# Altium schematic symbol library IC_ADI.SCHLIB: 3169 symbols (part 128 of 181)
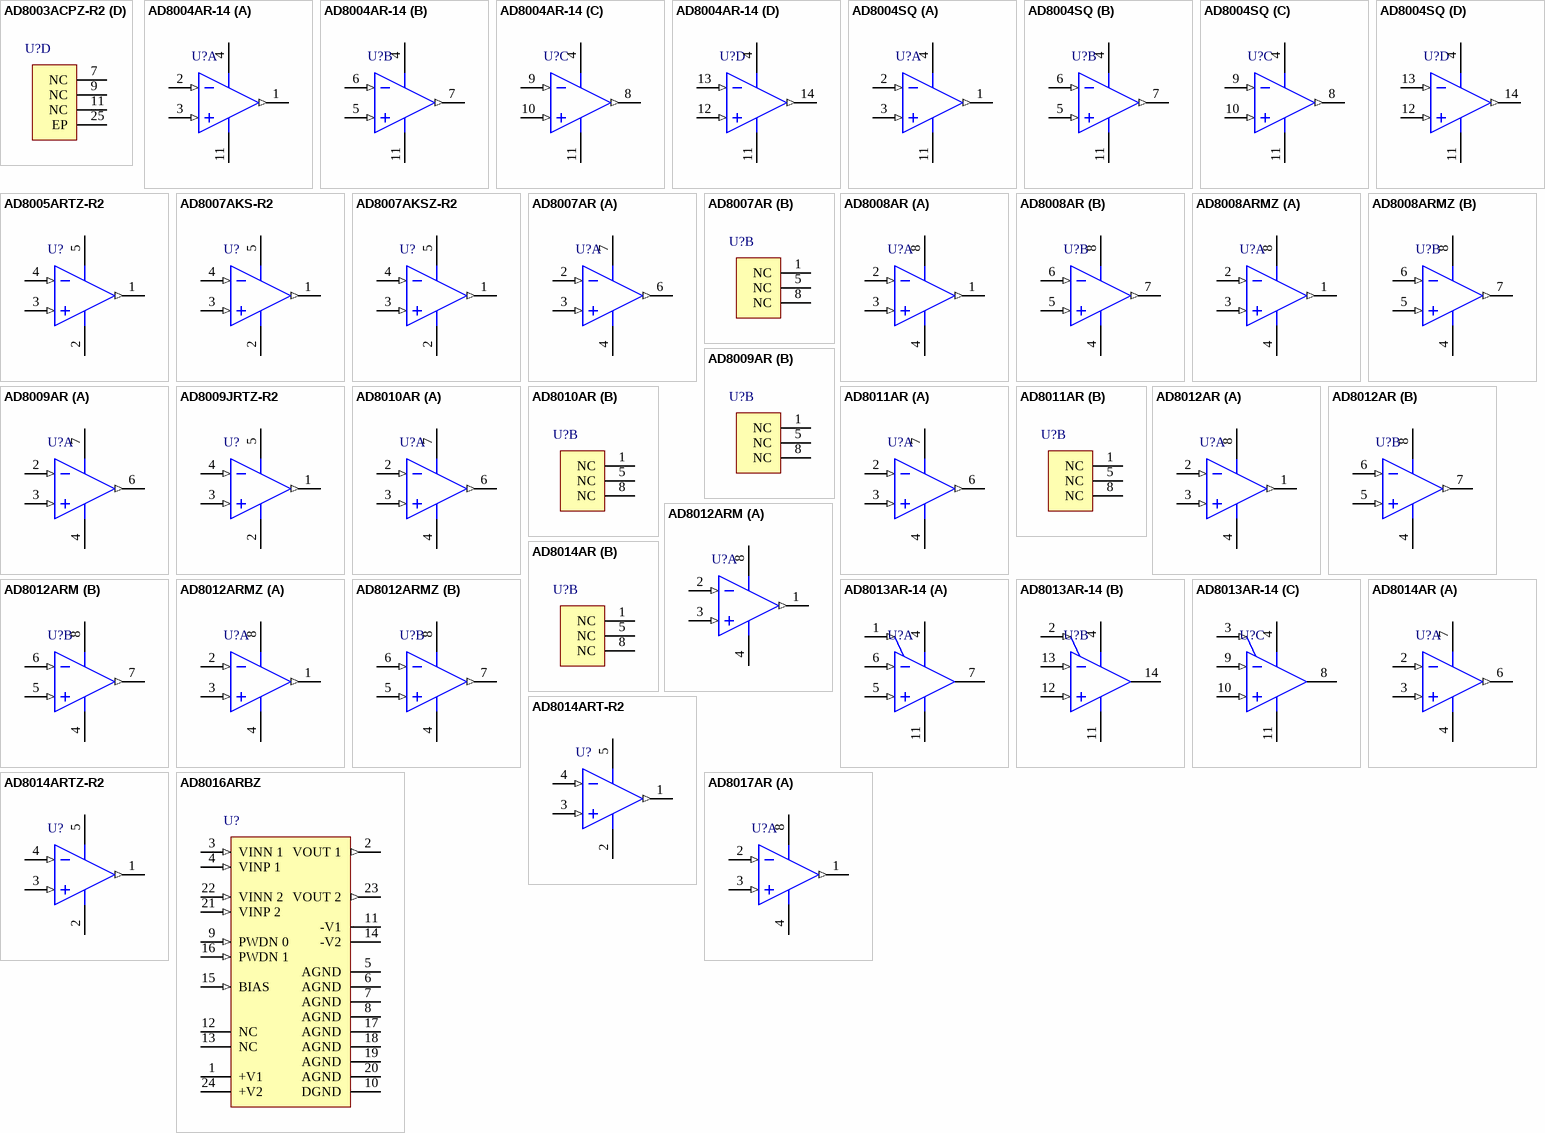
[diagram p318: symbols AD8003ACPZ-R2 to AD8017AR]

## AD8009AR
designator U?
Single Channel Wide Bandwidth Operational Amplifier, 1 GHz BW, 5.5 KV/us SR, Industrial, 8-pin SOIC (R-8), Tube; Generic Part Number: AD8009; PartNumber: AD8009AR; Amplifiers Per Package: 1; Input Bias Current: 50uA; Input Offset Voltage: 2mV; Iq/Amp: 16mA; Small Signal Bandwidth: 1GHz; V Span Max: 12V; V Span Min: 5V; DatasheetVersion: Rev. F; PackageVersion: 060506-A; PackageReference: R-8; PackageDescription: 8-Pin Standard Small Outline Package, Body 3.9 x 4.9 mm, Pitch 1.27 mm; Supplier Part Number 1: AD8009AR-ND; Packing: Tube; Slew Rate: 5.5KV/us; Mounting Technology: Surface Mount; Code_JEDEC: MS-012-AA; ComponentLink1Description: Manufacturer URL; ComponentLink2Description: Datasheet; ComponentLink3Description: Package Specification
footprint SOIC8_1.27 (Footprint not found)
part A pins: 2 -IN (in), 3 +IN (in), 4 -VS (power), 6 OUT (out), 7 +VS (power)
part B pins: 1 NC, 5 NC, 8 NC

## AD8009JRTZ-R2
designator U?
Single Channel Wide Bandwidth Operational Amplifier, 1 GHz BW, 5.5 KV/us SR, Commercial, 5-pin SOT23 (RJ-5), Reel; Generic Part Number: AD8009; PartNumber: AD8009JRTZ-R2; Amplifiers Per Package: 1; Input Bias Current: 50uA; Input Offset Voltage: 2mV; Iq/Amp: 16mA; Small Signal Bandwidth: 1GHz; V Span Max: 12V; V Span Min: 5V; DatasheetVersion: Rev. F; PackageVersion: 121608-A; PackageReference: RJ-5; PackageDescription: 5-Pin Small Outline Transistor Package, Body 2.9 x 1.6 mm, Pitch 0.95 mm; Supplier Part Number 1: AD8009JRTZ-R2CT-ND; Supplier Part Number 2: 1651269; Supplier Part Number 3: 1651269RL; Supplier Part Number 4: 19M8868; Packing: Reel; Slew Rate: 5.5KV/us; Mounting Technology: Surface Mount; Code_JEDEC: MO-178-AA; ComponentLink1Description: Manufacturer URL; ComponentLink2Description: Datasheet; ComponentLink3Description: Package Specification
footprint SOT23-5 (Footprint not found)
pins: 1 VOUT (out), 2 -VS (power), 3 +IN (in), 4 -IN (in), 5 +VS (power)

## AD8010AR
designator U?
Single Channel Operational Amplifier, 230 MHz BW, 800 V/us SR, Industrial, 8-pin SOIC (R-8), Tube; Generic Part Number: AD8010; PartNumber: AD8010AR; Amplifiers Per Package: 1; Input Bias Current: 6uA; Input Offset Voltage: 5mV; Iq/Amp: 17mA; Small Signal Bandwidth: 230MHz; V Span Max: 12V; V Span Min: 9V; DatasheetVersion: Rev. B; PackageVersion: 060506-A; PackageReference: R-8; PackageDescription: 8-Pin Standard Small Outline Package, Body 3.9 x 4.9 mm, Pitch 1.27 mm; Supplier Part Number 1: AD8010AR-ND; Slew Rate: 800V/us; Mounting Technology: Surface Mount; Code_JEDEC: MS-012-AA; ComponentLink1Description: Manufacturer URL; ComponentLink2Description: Datasheet; ComponentLink3Description: Package Specification
footprint SOIC8_1.27 (Footprint not found)
part A pins: 2 -IN (in), 3 +IN (in), 4 -VS (power), 6 OUT (out), 7 +VS (power)
part B pins: 1 NC, 5 NC, 8 NC

## AD8011AR
designator U?
Single Channel Single-Supply Operation Operational Amplifier, 400 MHz BW, 3.5 KV/us SR, Industrial, 8-pin SOIC (R-8), Tube; Generic Part Number: AD8011; PartNumber: AD8011AR; Amplifiers Per Package: 1; Input Bias Current: 5uA; Input Offset Voltage: 2mV; Iq/Amp: 1.3mA; Small Signal Bandwidth: 400MHz; V Span Max: 12V; V Span Min: 3V; DatasheetVersion: Rev. C; PackageVersion: 060506-A; PackageReference: R-8; PackageDescription: 8-Pin Standard Small Outline Package, Body 3.9 x 4.9 mm, Pitch 1.27 mm; Supplier Part Number 1: AD8011AR-ND; Slew Rate: 3.5KV/us; Mounting Technology: Surface Mount; Code_JEDEC: MS-012-AA; ComponentLink1Description: Manufacturer URL; ComponentLink2Description: Datasheet; ComponentLink3Description: Package Specification
footprint SOIC8_1.27 (Footprint not found)
part A pins: 2 -IN (in), 3 +IN (in), 4 -V (power), 6 OUT (out), 7 +V (power)
part B pins: 1 NC, 5 NC, 8 NC

## AD8012AR
designator U?
Double Channel Low Power Operational Amplifier, 350 MHz BW, 2.25 KV/us SR, Industrial, 8-pin SOIC (R-8), Tube; Generic Part Number: AD8012; PartNumber: AD8012AR; Amplifiers Per Package: 2; Input Bias Current: 3uA; Input Offset Voltage: 1mV; Iq/Amp: 900uA; Small Signal Bandwidth: 350MHz; V Span Max: 12V; V Span Min: 3V; DatasheetVersion: Rev. B; PackageVersion: 060506-A; PackageReference: R-8; PackageDescription: 8-Pin Standard Small Outline Package, Body 3.9 x 4.9 mm, Pitch 1.27 mm; Supplier Part Number 1: AD8012AR-ND; Packing: Tube; Slew Rate: 2.25KV/us; Mounting Technology: Surface Mount; Code_JEDEC: MS-012-AA; ComponentLink1Description: Manufacturer URL; ComponentLink2Description: Datasheet; ComponentLink3Description: Package Specification
footprint SOIC8_1.27 (Footprint not found)
pins on every part: 4 -VS (power), 8 +VS (power)
part A pins: 1 OUT 1 (out), 2 -IN 1 (in), 3 +IN 1 (in)
part B pins: 5 +IN 2 (in), 6 -IN 2 (in), 7 OUT 2 (out)

## AD8012ARM
designator U?
Double Channel Low Power Operational Amplifier, 350 MHz BW, 2.25 KV/us SR, Industrial, 8-pin SOP (RM-8), Tube; Generic Part Number: AD8012; PartNumber: AD8012ARM; Amplifiers Per Package: 2; Input Bias Current: 3uA; Input Offset Voltage: 1mV; Iq/Amp: 900uA; Small Signal Bandwidth: 350MHz; V Span Max: 12V; V Span Min: 3V; DatasheetVersion: Rev. B; PackageReference: RM-8; PackageDescription: 8-Pin Mini Small Outline Package, Body 3 x 3 mm, Pitch 0.65 mm; Supplier Part Number 1: AD8012ARM-ND; Packing: Tube; Slew Rate: 2.25KV/us; Mounting Technology: Surface Mount; Code_JEDEC: MO-187-AA; ComponentLink1Description: Manufacturer URL; ComponentLink2Description: Datasheet; ComponentLink3Description: Package Specification
footprint VSSOP8_0.65 (Footprint not found)
pins on every part: 4 -VS (power), 8 +VS (power)
part A pins: 1 OUT 1 (out), 2 -IN 1 (in), 3 +IN 1 (in)
part B pins: 5 +IN 2 (in), 6 -IN 2 (in), 7 OUT 2 (out)

## AD8012ARMZ
designator U?
Double Channel Low Power Operational Amplifier, 350 MHz BW, 2.25 KV/us SR, Industrial, 8-pin SOP (RM-8), Tube; Generic Part Number: AD8012; PartNumber: AD8012ARMZ; Amplifiers Per Package: 2; Input Bias Current: 3uA; Input Offset Voltage: 1mV; Iq/Amp: 900uA; Small Signal Bandwidth: 350MHz; V Span Max: 12V; V Span Min: 3V; DatasheetVersion: Rev. B; PackageReference: RM-8; PackageDescription: 8-Pin Mini Small Outline Package, Body 3 x 3 mm, Pitch 0.65 mm; Supplier Part Number 1: AD8012ARMZ-ND; Supplier Part Number 2: 1424017; Supplier Part Number 3: 82H2943; Packing: Tube; Slew Rate: 2.25KV/us; Mounting Technology: Surface Mount; Code_JEDEC: MO-187-AA; ComponentLink1Description: Manufacturer URL; ComponentLink2Description: Datasheet; ComponentLink3Description: Package Specification
footprint VSSOP8_0.65 (Footprint not found)
pins on every part: 4 -VS (power), 8 +VS (power)
part A pins: 1 OUT 1 (out), 2 -IN 1 (in), 3 +IN 1 (in)
part B pins: 5 +IN 2 (in), 6 -IN 2 (in), 7 OUT 2 (out)

## AD8013AR-14
designator U?
3 Channel Low Power Operational Amplifier, 480 MHz BW, 1 KV/us SR, Industrial, 14-pin SOIC (R-14), Tube; Generic Part Number: AD8013; PartNumber: AD8013AR-14; Amplifiers Per Package: 3; Input Bias Current: 3uA; Input Offset Voltage: 2mV; Iq/Amp: 4mA; Slew Rate: 1KV/us; Small Signal Bandwidth: 480MHz; V Span Max: 13V; V Span Min: 4.2V; DatasheetVersion: Rev. A; PackageVersion: 060606-A; PackageReference: R-14; PackageDescription: 14-Pin Standard Small Outline Package, Body 8.65 x 3.9 mm, Pitch 1.27 mm; Supplier Part Number 1: AD8013AR-14-ND; Mounting Technology: Surface Mount; Code_JEDEC: MS-012-AB; ComponentLink1Description: Manufacturer URL; ComponentLink2Description: Datasheet; ComponentLink3Description: Package Specification
footprint SOIC14_1.27 (Footprint not found)
pins on every part: 4 +VS (power), 11 -VS (power)
part A pins: 1 DISABLE 1 (in), 5 +IN 1 (in), 6 -IN 1 (in), 7 OUT 1 (hiz)
part B pins: 2 DISABLE 2 (in), 12 +IN 2 (in), 13 -IN 2 (in), 14 OUT 2 (hiz)
part C pins: 3 DISABLE 3 (in), 8 OUT 3 (hiz), 9 -IN 3 (in), 10 +IN 3 (in)

## AD8014AR
designator U?
Single Channel Very Low Noise Operational Amplifier, 400 MHz BW, 4 KV/us SR, Industrial, 8-pin SOIC (R-8), Tube; Generic Part Number: AD8014; PartNumber: AD8014AR; Amplifiers Per Package: 1; Input Bias Current: 5uA; Input Offset Voltage: 2mV; Iq/Amp: 1.3mA; Slew Rate: 4KV/us; Small Signal Bandwidth: 400MHz; V Span Max: 12V; V Span Min: 4.5V; DatasheetVersion: Rev. C; PackageVersion: 060506-A; PackageReference: R-8; PackageDescription: 8-Pin Standard Small Outline Package, Body 3.9 x 4.9 mm, Pitch 1.27 mm; Supplier Part Number 1: AD8014AR-ND; Mounting Technology: Surface Mount; Code_JEDEC: MS-012-AA; ComponentLink1Description: Manufacturer URL; ComponentLink2Description: Datasheet; ComponentLink3Description: Package Specification
footprint SOIC8_1.27 (Footprint not found)
part A pins: 2 -IN (in), 3 +IN (in), 4 -VS (power), 6 VOUT (out), 7 +VS (power)
part B pins: 1 NC, 5 NC, 8 NC

## AD8014ART-R2
designator U?
Single Channel Very Low Noise Operational Amplifier, 400 MHz BW, 4 KV/us SR, Industrial, 5-pin SOT23 (RJ-5), Reel; Generic Part Number: AD8014; PartNumber: AD8014ART-R2; Amplifiers Per Package: 1; Input Bias Current: 5uA; Input Offset Voltage: 2mV; Iq/Amp: 1.3mA; Slew Rate: 4KV/us; Small Signal Bandwidth: 400MHz; V Span Max: 12V; V Span Min: 4.5V; DatasheetVersion: Rev. C; PackageVersion: 121608-A; PackageReference: RJ-5; PackageDescription: 5-Pin Small Outline Transistor Package, Body 2.9 x 1.6 mm, Pitch 0.95 mm; Mounting Technology: Surface Mount; Code_JEDEC: MO-178-AA; ComponentLink1Description: Manufacturer URL; ComponentLink2Description: Datasheet; ComponentLink3Description: Package Specification
footprint SOT23-5 (Footprint not found)
pins: 1 VOUT (out), 2 -VS (power), 3 +IN (in), 4 -IN (in), 5 +VS (power)

## AD8014ARTZ-R2
designator U?
Single Channel Very Low Noise Operational Amplifier, 400 MHz BW, 4 KV/us SR, Industrial, 5-pin SOT23 (RJ-5), Reel; Generic Part Number: AD8014; PartNumber: AD8014ARTZ-R2; Amplifiers Per Package: 1; Input Bias Current: 5uA; Input Offset Voltage: 2mV; Iq/Amp: 1.3mA; Slew Rate: 4KV/us; Small Signal Bandwidth: 400MHz; V Span Max: 12V; V Span Min: 4.5V; DatasheetVersion: Rev. C; PackageVersion: 121608-A; PackageReference: RJ-5; PackageDescription: 5-Pin Small Outline Transistor Package, Body 2.9 x 1.6 mm, Pitch 0.95 mm; Supplier Part Number 1: 2074877; Supplier Part Number 2: 2074877RL; Supplier Part Number 3: 76T1820; Mounting Technology: Surface Mount; Code_JEDEC: MO-178-AA; ComponentLink1Description: Manufacturer URL; ComponentLink2Description: Datasheet; ComponentLink3Description: Package Specification
footprint SOT23-5 (Footprint not found)
pins: 1 VOUT (out), 2 -VS (power), 3 +IN (in), 4 -IN (in), 5 +VS (power)

## AD8016ARBZ
designator U?
Double Channel Low Power Operational Amplifier, 380 MHz BW, 1 KV/us SR, Industrial, 24-pin SOIC (RB-24), Tube; Generic Part Number: AD8016; PartNumber: AD8016ARBZ; Amplifiers Per Package: 2; Input Bias Current: 45uA; Input Offset Voltage: 1mV; Iq/Amp: 13.2mA; Slew Rate: 1KV/us; Small Signal Bandwidth: 380MHz; V Span Max: 26V; V Span Min: 6V; DatasheetVersion: 02-23-2012-A; PackageReference: RB-24; PackageDescription: 24-Pin Batwing SOIC, Thermally Enhanced with Fused Leads, Body 15.4 x 7.5 mm, Pitch 1.27 mm; Supplier Part Number 1: AD8016ARBZ-ND; Supplier Part Number 2: 59K6181; Mounting Technology: Surface Mount; Code_JEDEC: MS-013-AD; ComponentLink1Description: Manufacturer URL; ComponentLink2Description: Datasheet; ComponentLink3Description: Package Specification
footprint SOIC24W_1.27 (Footprint not found)
pins: 1 +V1 (power) "Positive Power Supply, Amp 1.", 2 VOUT 1 (out) "Output Signal, Amp 1.", 3 VINN 1 (in) "Negative Input Signal, Amp 1.", 4 VINP 1 (in) "Positive Input Signal, Amp1.", 5 AGND (power) "Analog Ground.", 6 AGND (power) "Analog Ground.", 7 AGND (power) "Analog Ground.", 8 AGND (power) "Analog Ground.", 9 PWDN 0 (in) "Power-Down Input 0.", 10 DGND (power) "Digital Ground.", 11 -V1 (power) "Negative Power Supply, Amp1.", 12 NC "This pin is not connected internally", 13 NC "This pin is not connected internally", 14 -V2 (power) "-V Power Supply, Amp 2.", 15 BIAS (in) "Quiescent Current Adjust.", 16 PWDN 1 (in) "Power-Down Input 1.", 17 AGND (power) "Analog Ground.", 18 AGND (power) "Analog Ground.", 19 AGND (power) "Analog Ground.", 20 AGND (power) "Analog Ground.", 21 VINP 2 (in) "Positive Input Signal, Amp 2.", 22 VINN 2 (in) "Negative Input Signal, Amp 2.", 23 VOUT 2 (out) "Output Signal, Amp 2.", 24 +V2 (power) "Positive Power Supply, Amp 2."

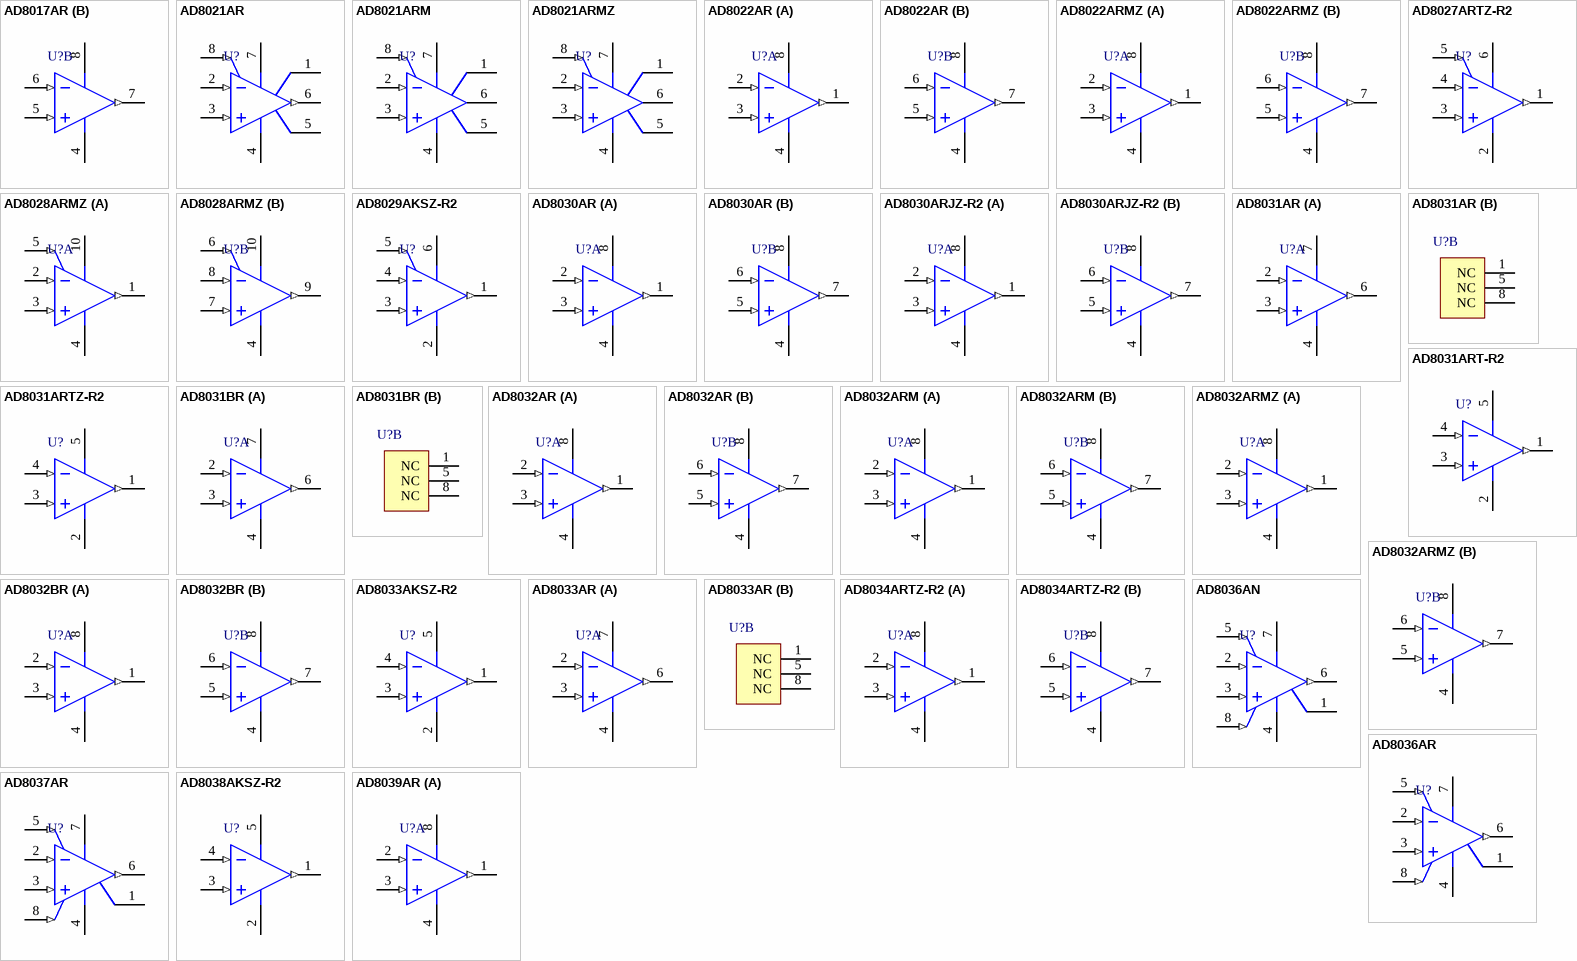
[diagram p91: symbols AD8017AR to AD8039AR]

## AD8017AR
designator U?
Double Channel Low Power Operational Amplifier, 160 MHz BW, 1.6 KV/us SR, Industrial, 8-pin SOIC (R-8), Tube; Generic Part Number: AD8017; PartNumber: AD8017AR; Amplifiers Per Package: 2; Input Bias Current: 160uA; Input Offset Voltage: 1.8mV; Iq/Amp: 7.7mA; Small Signal Bandwidth: 160MHz; V Span Max: 12V; V Span Min: 4.4V; DatasheetVersion: Rev. C; PackageVersion: 060506-A; PackageReference: R-8; PackageDescription: 8-Pin Standard Small Outline Package, Body 3.9 x 4.9 mm, Pitch 1.27 mm; Supplier Part Number 1: AD8017AR-ND; Slew Rate: 1.6KV/us; Mounting Technology: Surface Mount; Code_JEDEC: MS-012-AA; ComponentLink1Description: Manufacturer URL; ComponentLink2Description: Datasheet; ComponentLink3Description: Package Specification
footprint SOIC8_1.27 (Footprint not found)
pins on every part: 4 -VS (power), 8 +VS (power)
part A pins: 1 OUT 1 (out), 2 -IN 1 (in), 3 +IN 1 (in)
part B pins: 5 +IN 2 (in), 6 -IN 2 (in), 7 OUT 2 (out)

## AD8021AR
designator U?
Single Channel Low Power Operational Amplifier, 490 MHz BW, 120 V/us SR, Industrial, 8-pin SOIC (R-8), Tube; Generic Part Number: AD8021; PartNumber: AD8021AR; Amplifiers Per Package: 1; Input Bias Current: 7.5uA; Input Offset Voltage: 400uV; Iq/Amp: 7.7mA; Small Signal Bandwidth: 490MHz; V Span Max: 24V; V Span Min: 4.5V; DatasheetVersion: Rev. F; PackageVersion: 060506-A; PackageReference: R-8; PackageDescription: 8-Pin Standard Small Outline Package, Body 3.9 x 4.9 mm, Pitch 1.27 mm; Supplier Part Number 1: AD8021AR-ND; Slew Rate: 120V/us; Mounting Technology: Surface Mount; Code_JEDEC: MS-012-AA; ComponentLink1Description: Manufacturer URL; ComponentLink2Description: Datasheet; ComponentLink3Description: Package Specification; ComponentLink4Description: Reference Circuit
footprint SOIC8_1.27 (Footprint not found)
pins: 1 LOGIC REFERENCE "Reference for Pin 81 Voltage Level. Connect to logic low supply.", 2 -IN (in) "Inverting Input.", 3 +IN (in) "Noninverting Input.", 4 -VS (power) "Negative Supply Voltage.", 5 CCOMP "Compensation Capacitor. Tie to -VS. (See the Applications section for value.)", 6 VOUT (out) "Output.", 7 +VS (power) "Positive Supply Voltage.", 8 ~{DISABLE} (in) "Disable, Active Low."

## AD8021ARM
designator U?
Single Channel Low Power Operational Amplifier, 490 MHz BW, 120 V/us SR, Industrial, 8-pin SOP (RM-8), Tube; Generic Part Number: AD8021; PartNumber: AD8021ARM; Amplifiers Per Package: 1; Input Bias Current: 7.5uA; Input Offset Voltage: 400uV; Iq/Amp: 7.7mA; Small Signal Bandwidth: 490MHz; V Span Max: 24V; V Span Min: 4.5V; DatasheetVersion: Rev. F; PackageReference: RM-8; PackageDescription: 8-Pin Mini Small Outline Package, Body 3 x 3 mm, Pitch 0.65 mm; Supplier Part Number 1: AD8021ARM-ND; Slew Rate: 120V/us; Mounting Technology: Surface Mount; Code_JEDEC: MO-187-AA; ComponentLink1Description: Manufacturer URL; ComponentLink2Description: Datasheet; ComponentLink3Description: Package Specification; ComponentLink4Description: Reference Circuit
footprint VSSOP8_0.65 (Footprint not found)
pins: 1 LOGIC REFERENCE "Reference for Pin 8 Voltage Level. Connect to logic low supply.", 2 -IN (in) "Inverting Input.", 3 +IN (in) "Noninverting Input.", 4 -VS (power) "Negative Supply Voltage.", 5 CCOMP "Compensation Capacitor. Tie to -VS. (See the Applications section for value.)", 6 VOUT (hiz) "Output.", 7 +VS (power) "Positive Supply Voltage.", 8 ~{DISABLE} (in) "Disable, Active Low."

## AD8021ARMZ
designator U?
Single Channel Low Power Operational Amplifier, 490 MHz BW, 120 V/us SR, Industrial, 8-pin SOP (RM-8), Tube; Generic Part Number: AD8021; PartNumber: AD8021ARMZ; Amplifiers Per Package: 1; Input Bias Current: 7.5uA; Input Offset Voltage: 400uV; Iq/Amp: 7.7mA; Small Signal Bandwidth: 490MHz; V Span Max: 24V; V Span Min: 4.5V; DatasheetVersion: Rev. F; PackageReference: RM-8; PackageDescription: 8-Pin Mini Small Outline Package, Body 3 x 3 mm, Pitch 0.65 mm; Supplier Part Number 1: AD8021ARMZ-ND; Supplier Part Number 2: 1651289; Supplier Part Number 3: 19M8871; Slew Rate: 120V/us; Mounting Technology: Surface Mount; Code_JEDEC: MO-187-AA; ComponentLink1Description: Manufacturer URL; ComponentLink2Description: Datasheet; ComponentLink3Description: Package Specification; ComponentLink4Description: Reference Circuit
footprint VSSOP8_0.65 (Footprint not found)
pins: 1 LOGIC REFERENCE "Reference for Pin 8 Voltage Level. Connect to logic low supply.", 2 -IN (in) "Inverting Input.", 3 +IN (in) "Noninverting Input.", 4 -VS (power) "Negative Supply Voltage.", 5 CCOMP "Compensation Capacitor. Tie to -VS. (See the Applications section for value.)", 6 VOUT (hiz) "Output.", 7 +VS (power) "Positive Supply Voltage.", 8 ~{DISABLE} (in) "Disable, Active Low."

## AD8022AR
designator U?
Double Channel Low Power Operational Amplifier, 130 MHz BW, 50 V/us SR, Industrial, 8-pin SOIC (R-8), Tube; Generic Part Number: AD8022; PartNumber: AD8022AR; Amplifiers Per Package: 2; Input Bias Current: 2.5uA; Input Offset Voltage: 1.5mV; Iq/Amp: 5.5mA; Slew Rate: 50V/us; Small Signal Bandwidth: 130MHz; V Span Max: 26V; V Span Min: 4.5V; DatasheetVersion: Rev. C; PackageVersion: 060506-A; PackageReference: R-8; PackageDescription: 8-Pin Standard Small Outline Package, Body 3.9 x 4.9 mm, Pitch 1.27 mm; Supplier Part Number 1: AD8022AR-ND; Mounting Technology: Surface Mount; Code_JEDEC: MS-012-AA; ComponentLink1Description: Manufacturer URL; ComponentLink2Description: Datasheet; ComponentLink3Description: Package Specification; ComponentLink4Description: Reference Circuit
footprint SOIC8_1.27 (Footprint not found)
pins on every part: 4 -VS (power), 8 +VS (power)
part A pins: 1 OUT 1 (out), 2 -IN 1 (in), 3 +IN 1 (in)
part B pins: 5 +IN 2 (in), 6 -IN 2 (in), 7 OUT 2 (out)

## AD8022ARMZ
designator U?
Double Channel Low Power Operational Amplifier, 130 MHz BW, 50 V/us SR, Industrial, 8-pin SOP (RM-8), Tube; Generic Part Number: AD8022; PartNumber: AD8022ARMZ; Amplifiers Per Package: 2; Input Bias Current: 2.5uA; Input Offset Voltage: 1.5mV; Iq/Amp: 5.5mA; Slew Rate: 50V/us; Small Signal Bandwidth: 130MHz; V Span Max: 26V; V Span Min: 4.5V; DatasheetVersion: Rev. C; PackageReference: RM-8; PackageDescription: 8-Pin Mini Small Outline Package, Body 3 x 3 mm, Pitch 0.65 mm; Supplier Part Number 1: AD8022ARMZ-ND; Supplier Part Number 2: 1699612; Supplier Part Number 3: 59K6199; Mounting Technology: Surface Mount; Code_JEDEC: MO-187-AA; ComponentLink1Description: Manufacturer URL; ComponentLink2Description: Datasheet; ComponentLink3Description: Package Specification; ComponentLink4Description: Reference Circuit
footprint VSSOP8_0.65 (Footprint not found)
pins on every part: 4 -VS (power), 8 +VS (power)
part A pins: 1 OUT 1 (out), 2 -IN 1 (in), 3 +IN 1 (in)
part B pins: 5 +IN 2 (in), 6 -IN 2 (in), 7 OUT 2 (out)

## AD8027ARTZ-R2
designator U?
Single Channel Low Power Operational Amplifier, 190 MHz BW, 100 V/us SR, Industrial, 6-pin SOT23 (RJ-6), Reel; Generic Part Number: AD8027; PartNumber: AD8027ARTZ-R2; Amplifiers Per Package: 1; Input Bias Current: 3.8uA; Input Offset Voltage: 200uV; Iq/Amp: 8.5mA; Small Signal Bandwidth: 190MHz; V Span Max: 12V; V Span Min: 2.7V; DatasheetVersion: Rev. C; PackageVersion: 121608-A; PackageReference: RJ-6; PackageDescription: 6-Pin Small Outline Transistor Package, Body 2.9 x 1.6 mm, Pitch 0.95 mm; Supplier Part Number 1: AD8027ARTZ-R2CT-ND; Slew Rate: 100V/us; Mounting Technology: Surface Mount; Code_JEDEC: MO-178-AB; ComponentLink1Description: Manufacturer URL; ComponentLink2Description: Datasheet; ComponentLink3Description: Package Specification
footprint SOT23-6 (Footprint not found)
pins: 1 VOUT (out), 2 -VS (power), 3 +IN (in), 4 -IN (in), 5 ~{DISABLE}/SELECT (in), 6 +VS (power)

## AD8028ARMZ
designator U?
Double Channel Low Power Operational Amplifier, 190 MHz BW, 100 V/us SR, Industrial, 10-pin SOP (RM-10), Tube; Generic Part Number: AD8028; PartNumber: AD8028ARMZ; Amplifiers Per Package: 2; Input Bias Current: 4uA; Input Offset Voltage: 200uV; Iq/Amp: 8.5mA; Small Signal Bandwidth: 190MHz; V Span Max: 12V; V Span Min: 2.7V; DatasheetVersion: Rev. C; PackageReference: RM-10; PackageDescription: 10-Pin Mini Small Outline Package, Body 3 x 3 mm, Pitch 0.5 mm; Supplier Part Number 1: AD8028ARMZ-ND; Supplier Part Number 2: 59K6213; Slew Rate: 100V/us; Mounting Technology: Surface Mount; Code_JEDEC: MO-187-BA; ComponentLink1Description: Manufacturer URL; ComponentLink2Description: Datasheet; ComponentLink3Description: Package Specification
footprint VSSOP10_0.5 (Footprint not found)
pins on every part: 4 -VS (power), 10 +VS (power)
part A pins: 1 VOUT A (out), 2 -IN A (in), 3 +IN A (in), 5 ~{DISABLE}/SELECT A (in)
part B pins: 6 ~{DISABLE}/SELECT B (in), 7 +IN B (in), 8 -IN B (in), 9 VOUT B (out)

## AD8029AKSZ-R2
designator U?
Single Channel RRIO Operational Amplifier, 125 MHz BW, 62 V/us SR, Industrial, 6-pin SOT23 (KS-6), Reel; Generic Part Number: AD8029; PartNumber: AD8029AKSZ-R2; Amplifiers Per Package: 1; Input Bias Current: 700nA; Input Offset Voltage: 1.6mV; Iq/Amp: 1.5mA; Slew Rate: 62V/us; Small Signal Bandwidth: 125MHz; V Span Max: 12V; V Span Min: 2.7V; DatasheetVersion: Rev. B; PackageVersion: 072809-A; PackageReference: KS-6; PackageDescription: 6-Pin Thin Shrink Small Outline Transistor Package, Body 2 x 1.25 mm, Pitch 0.65 mm; Supplier Part Number 1: AD8029AKSZ-R2CT-ND; Supplier Part Number 2: 59K6221; Mounting Technology: Surface Mount; Code_JEDEC: MO-203-AB; ComponentLink1Description: Manufacturer URL; ComponentLink2Description: Datasheet; ComponentLink3Description: Package Specification
footprint SOT363 (Footprint not found)
pins: 1 VOUT (out), 2 -VS (power), 3 +IN (in), 4 -IN (in), 5 ~{DISABLE} (in), 6 +VS (power)

## AD8030AR
designator U?
Double Channel RRIO Operational Amplifier, 125 MHz BW, 62 V/us SR, Industrial, 8-pin SOIC (R-8), Tube; Generic Part Number: AD8030; PartNumber: AD8030AR; Amplifiers Per Package: 2; Input Bias Current: 700nA; Input Offset Voltage: 1.6mV; Iq/Amp: 1.5mA; Slew Rate: 62V/us; Small Signal Bandwidth: 125MHz; V Span Max: 12V; V Span Min: 2.7V; DatasheetVersion: Rev. B; PackageVersion: 060506-A; PackageReference: R-8; PackageDescription: 8-Pin Standard Small Outline Package, Body 3.9 x 4.9 mm, Pitch 1.27 mm; Supplier Part Number 1: AD8030AR-ND; Mounting Technology: Surface Mount; Code_JEDEC: MS-012-AA; ComponentLink1Description: Manufacturer URL; ComponentLink2Description: Datasheet; ComponentLink3Description: Package Specification
footprint SOIC8_1.27 (Footprint not found)
pins on every part: 4 -VS (power), 8 +VS (power)
part A pins: 1 VOUT 1 (out), 2 -IN 1 (in), 3 +IN 1 (in)
part B pins: 5 +IN 2 (in), 6 -IN 2 (in), 7 VOUT 2 (out)

## AD8030ARJZ-R2
designator U?
Double Channel RRIO Operational Amplifier, 125 MHz BW, 62 V/us SR, Industrial, 8-pin SOT23 (RJ-8), Reel; Generic Part Number: AD8030; PartNumber: AD8030ARJZ-R2; Amplifiers Per Package: 2; Input Bias Current: 700nA; Input Offset Voltage: 1.6mV; Iq/Amp: 1.5mA; Slew Rate: 62V/us; Small Signal Bandwidth: 125MHz; V Span Max: 12V; V Span Min: 2.7V; DatasheetVersion: Rev. B; PackageVersion: 121608-A; PackageReference: RJ-8; PackageDescription: 8-Pin Small Outline Transistor Package, Body 2.9 x 1.6 mm, Pitch 0.65 mm; Mounting Technology: Surface Mount; Code_JEDEC: MO-178-BA; ComponentLink1Description: Manufacturer URL; ComponentLink2Description: Datasheet; ComponentLink3Description: Package Specification
footprint SOT23-8 (Footprint not found)
pins on every part: 4 -VS (power), 8 +VS (power)
part A pins: 1 VOUT 1 (out), 2 -IN 1 (in), 3 +IN 1 (in)
part B pins: 5 +IN 2 (in), 6 -IN 2 (in), 7 VOUT 2 (out)

## AD8031AR
designator U?
Single Channel RRIO Operational Amplifier, 80 MHz BW, 35 V/us SR, Industrial, 8-pin SOIC (R-8), Tube; Generic Part Number: AD8031; PartNumber: AD8031AR; Amplifiers Per Package: 1; Input Bias Current: 450nA; Input Offset Voltage: 1mV; Iq/Amp: 900uA; Slew Rate: 35V/us; Small Signal Bandwidth: 80MHz; V Span Max: 12V; V Span Min: 2.7V; DatasheetVersion: Rev. D; PackageVersion: 060506-A; PackageReference: R-8; PackageDescription: 8-Pin Standard Small Outline Package, Body 3.9 x 4.9 mm, Pitch 1.27 mm; Supplier Part Number 1: AD8031AR-ND; Packing: Tube; Mounting Technology: Surface Mount; Code_JEDEC: MS-012-AA; ComponentLink1Description: Manufacturer URL; ComponentLink2Description: Datasheet; ComponentLink3Description: Package Specification; ComponentLink4Description: Reference Circuit
footprint SOIC8_1.27 (Footprint not found)
part A pins: 2 -IN (in), 3 +IN (in), 4 -VS (power), 6 OUT (out), 7 +VS (power)
part B pins: 1 NC, 5 NC, 8 NC

## AD8031ART-R2
designator U?
Single Channel RRIO Operational Amplifier, 80 MHz BW, 35 V/us SR, Industrial, 5-pin SOT23 (RJ-5), Reel; Generic Part Number: AD8031; PartNumber: AD8031ART-R2; Amplifiers Per Package: 1; Input Bias Current: 450nA; Input Offset Voltage: 1mV; Iq/Amp: 900uA; Slew Rate: 35V/us; Small Signal Bandwidth: 80MHz; V Span Max: 12V; V Span Min: 2.7V; DatasheetVersion: Rev. D; PackageVersion: 121608-A; PackageReference: RJ-5; PackageDescription: 5-Pin Small Outline Transistor Package, Body 2.9 x 1.6 mm, Pitch 0.95 mm; Supplier Part Number 1: 61H4955; Packing: Reel; Mounting Technology: Surface Mount; Code_JEDEC: MO-178-AA; ComponentLink1Description: Manufacturer URL; ComponentLink2Description: Datasheet; ComponentLink3Description: Package Specification; ComponentLink4Description: Reference Circuit
footprint SOT23-5 (Footprint not found)
pins: 1 VOUT (out), 2 -VS (power), 3 +IN (in), 4 -IN (in), 5 +VS (power)

## AD8031ARTZ-R2
designator U?
Single Channel RRIO Operational Amplifier, 80 MHz BW, 35 V/us SR, Industrial, 5-pin SOT23 (RJ-5), Reel; Generic Part Number: AD8031; PartNumber: AD8031ARTZ-R2; Amplifiers Per Package: 1; Input Bias Current: 450nA; Input Offset Voltage: 1mV; Iq/Amp: 900uA; Slew Rate: 35V/us; Small Signal Bandwidth: 80MHz; V Span Max: 12V; V Span Min: 2.7V; DatasheetVersion: Rev. D; PackageVersion: 121608-A; PackageReference: RJ-5; PackageDescription: 5-Pin Small Outline Transistor Package, Body 2.9 x 1.6 mm, Pitch 0.95 mm; Supplier Part Number 1: 19M8875; Packing: Reel; Mounting Technology: Surface Mount; Code_JEDEC: MO-178-AA; ComponentLink1Description: Manufacturer URL; ComponentLink2Description: Datasheet; ComponentLink3Description: Package Specification; ComponentLink4Description: Reference Circuit
footprint SOT23-5 (Footprint not found)
pins: 1 VOUT (out), 2 -VS (power), 3 +IN (in), 4 -IN (in), 5 +VS (power)

## AD8031BR
designator U?
Single Channel RRIO Operational Amplifier, 80 MHz BW, 35 V/us SR, Industrial, 8-pin SOIC (R-8), Tube; Generic Part Number: AD8031; PartNumber: AD8031BR; Amplifiers Per Package: 1; Input Bias Current: 450nA; Input Offset Voltage: 0.5mV; Iq/Amp: 900uA; Slew Rate: 35V/us; Small Signal Bandwidth: 80MHz; V Span Max: 12V; V Span Min: 2.7V; DatasheetVersion: Rev. D; PackageVersion: 060506-A; PackageReference: R-8; PackageDescription: 8-Pin Standard Small Outline Package, Body 3.9 x 4.9 mm, Pitch 1.27 mm; Supplier Part Number 1: AD8031BR-ND; Packing: Tube; Mounting Technology: Surface Mount; Code_JEDEC: MS-012-AA; ComponentLink1Description: Manufacturer URL; ComponentLink2Description: Datasheet; ComponentLink3Description: Package Specification; ComponentLink4Description: Reference Circuit
footprint SOIC8_1.27 (Footprint not found)
part A pins: 2 -IN (in), 3 +IN (in), 4 -VS (power), 6 OUT (out), 7 +VS (power)
part B pins: 1 NC, 5 NC, 8 NC

## AD8032AR
designator U?
Double Channel RRIO Operational Amplifier, 80 MHz BW, 35 V/us SR, Industrial, 8-pin SOIC (R-8), Tube; Generic Part Number: AD8032; PartNumber: AD8032AR; Amplifiers Per Package: 2; Input Bias Current: 450nA; Input Offset Voltage: 1mV; Iq/Amp: 1.6mA; Slew Rate: 35V/us; Small Signal Bandwidth: 80MHz; V Span Max: 12V; V Span Min: 2.7V; DatasheetVersion: Rev. D; PackageVersion: 060506-A; PackageReference: R-8; PackageDescription: 8-Pin Standard Small Outline Package, Body 3.9 x 4.9 mm, Pitch 1.27 mm; Supplier Part Number 1: AD8032AR-ND; Packing: Tube; Mounting Technology: Surface Mount; Code_JEDEC: MS-012-AA; ComponentLink1Description: Manufacturer URL; ComponentLink2Description: Datasheet; ComponentLink3Description: Package Specification; ComponentLink4Description: Reference Circuit
footprint SOIC8_1.27 (Footprint not found)
pins on every part: 4 -VS (power), 8 +VS (power)
part A pins: 1 OUT 1 (out), 2 -IN 1 (in), 3 +IN 1 (in)
part B pins: 5 +IN 2 (in), 6 -IN 2 (in), 7 OUT 2 (out)

## AD8032ARM
designator U?
Double Channel RRIO Operational Amplifier, 80 MHz BW, 35 V/us SR, Industrial, 8-pin SOP (RM-8), Tube; Generic Part Number: AD8032; PartNumber: AD8032ARM; Amplifiers Per Package: 2; Input Bias Current: 450nA; Input Offset Voltage: 1mV; Iq/Amp: 1.6mA; Slew Rate: 35V/us; Small Signal Bandwidth: 80MHz; V Span Max: 12V; V Span Min: 2.7V; DatasheetVersion: Rev. D; PackageReference: RM-8; PackageDescription: 8-Pin Mini Small Outline Package, Body 3 x 3 mm, Pitch 0.65 mm; Supplier Part Number 1: AD8032ARM-ND; Packing: Tube; Mounting Technology: Surface Mount; Code_JEDEC: MO-187-AA; ComponentLink1Description: Manufacturer URL; ComponentLink2Description: Datasheet; ComponentLink3Description: Package Specification; ComponentLink4Description: Reference Circuit
footprint VSSOP8_0.65 (Footprint not found)
pins on every part: 4 -VS (power), 8 +VS (power)
part A pins: 1 OUT 1 (out), 2 -IN 1 (in), 3 +IN 1 (in)
part B pins: 5 +IN 2 (in), 6 -IN 2 (in), 7 OUT 2 (out)

## AD8032ARMZ
designator U?
Double Channel RRIO Operational Amplifier, 80 MHz BW, 35 V/us SR, Industrial, 8-pin SOP (RM-8), Tube; Generic Part Number: AD8032; PartNumber: AD8032ARMZ; Amplifiers Per Package: 2; Input Bias Current: 450nA; Input Offset Voltage: 1mV; Iq/Amp: 1.6mA; Slew Rate: 35V/us; Small Signal Bandwidth: 80MHz; V Span Max: 12V; V Span Min: 2.7V; DatasheetVersion: Rev. D; PackageReference: RM-8; PackageDescription: 8-Pin Mini Small Outline Package, Body 3 x 3 mm, Pitch 0.65 mm; Supplier Part Number 1: AD8032ARMZ-ND; Supplier Part Number 2: 1660973; Supplier Part Number 3: 19M8876; Packing: Tube; Mounting Technology: Surface Mount; Code_JEDEC: MO-187-AA; ComponentLink1Description: Manufacturer URL; ComponentLink2Description: Datasheet; ComponentLink3Description: Package Specification; ComponentLink4Description: Reference Circuit
footprint VSSOP8_0.65 (Footprint not found)
pins on every part: 4 -VS (power), 8 +VS (power)
part A pins: 1 OUT 1 (out), 2 -IN 1 (in), 3 +IN 1 (in)
part B pins: 5 +IN 2 (in), 6 -IN 2 (in), 7 OUT 2 (out)

## AD8032BR
designator U?
Double Channel RRIO Operational Amplifier, 80 MHz BW, 35 V/us SR, Industrial, 8-pin SOIC (R-8), Tube; Generic Part Number: AD8032; PartNumber: AD8032BR; Amplifiers Per Package: 2; Input Bias Current: 450nA; Input Offset Voltage: 0.5mV; Iq/Amp: 1.6mA; Slew Rate: 35V/us; Small Signal Bandwidth: 80MHz; V Span Max: 12V; V Span Min: 2.7V; DatasheetVersion: Rev. D; PackageVersion: 060506-A; PackageReference: R-8; PackageDescription: 8-Pin Standard Small Outline Package, Body 3.9 x 4.9 mm, Pitch 1.27 mm; Supplier Part Number 1: AD8032BR-ND; Supplier Part Number 2: 16F7608; Packing: Tube; Mounting Technology: Surface Mount; Code_JEDEC: MS-012-AA; ComponentLink1Description: Manufacturer URL; ComponentLink2Description: Datasheet; ComponentLink3Description: Package Specification; ComponentLink4Description: Reference Circuit
footprint SOIC8_1.27 (Footprint not found)
pins on every part: 4 -VS (power), 8 +VS (power)
part A pins: 1 OUT 1 (out), 2 -IN 1 (in), 3 +IN 1 (in)
part B pins: 5 +IN 2 (in), 6 -IN 2 (in), 7 OUT 2 (out)

## AD8033AKSZ-R2
designator U?
Single Channel Very Low Cost Operational Amplifier, 80 MHz BW, 80 V/us SR, Industrial, 5-pin SOT23 (KS-5), Reel; Generic Part Number: AD8033; PartNumber: AD8033AKSZ-R2; Amplifiers Per Package: 1; Input Bias Current: 1.5pA; Input Offset Voltage: 1mV; Iq/Amp: 3.5mA; Slew Rate: 80V/us; Small Signal Bandwidth: 80MHz; V Span Max: 24V; V Span Min: 5V; DatasheetVersion: Rev. D; PackageVersion: 072809-A; PackageReference: KS-5; PackageDescription: 5-Pin Thin Shrink Small Outline Transistor Package, Body 2 x 1.25 mm, Pitch 0.65 mm; Supplier Part Number 1: 28M4089; Mounting Technology: Surface Mount; Code_JEDEC: MO-203-AA; ComponentLink1Description: Manufacturer URL; ComponentLink2Description: Datasheet; ComponentLink3Description: Package Specification
footprint SOT353 (Footprint not found)
pins: 1 VOUT (out), 2 -VS (power), 3 +IN (in), 4 -IN (in), 5 +VS (power)

## AD8033AR
designator U?
Single Channel Very Low Cost Operational Amplifier, 80 MHz BW, 80 V/us SR, Industrial, 8-pin SOIC (R-8), Tube; Generic Part Number: AD8033; PartNumber: AD8033AR; Amplifiers Per Package: 1; Input Bias Current: 1.5pA; Input Offset Voltage: 1mV; Iq/Amp: 3.5mA; Slew Rate: 80V/us; Small Signal Bandwidth: 80MHz; V Span Max: 24V; V Span Min: 5V; DatasheetVersion: Rev. D; PackageVersion: 060506-A; PackageReference: R-8; PackageDescription: 8-Pin Standard Small Outline Package, Body 3.9 x 4.9 mm, Pitch 1.27 mm; Supplier Part Number 1: AD8033AR-ND; Mounting Technology: Surface Mount; Code_JEDEC: MS-012-AA; ComponentLink1Description: Manufacturer URL; ComponentLink2Description: Datasheet; ComponentLink3Description: Package Specification
footprint SOIC8_1.27 (Footprint not found)
part A pins: 2 -IN (in), 3 +IN (in), 4 -VS (power), 6 VOUT (out), 7 +VS (power)
part B pins: 1 NC, 5 NC, 8 NC

## AD8034ARTZ-R2
designator U?
Double Channel Very Low Cost Operational Amplifier, 80 MHz BW, 80 V/us SR, Industrial, 8-pin SOT23 (RJ-8), Reel; Generic Part Number: AD8034; PartNumber: AD8034ARTZ-R2; Amplifiers Per Package: 2; Input Bias Current: 1.5pA; Input Offset Voltage: 1mV; Iq/Amp: 3.5mA; Slew Rate: 80V/us; Small Signal Bandwidth: 80MHz; V Span Max: 24V; V Span Min: 5V; DatasheetVersion: Rev. D; PackageVersion: 121608-A; PackageReference: RJ-8; PackageDescription: 8-Pin Small Outline Transistor Package, Body 2.9 x 1.6 mm, Pitch 0.65 mm; Supplier Part Number 1: 2074884RL; Supplier Part Number 2: 2074884; Supplier Part Number 3: 88H0124; Mounting Technology: Surface Mount; Code_JEDEC: MO-178-BA; ComponentLink1Description: Manufacturer URL; ComponentLink2Description: Datasheet; ComponentLink3Description: Package Specification; ComponentLink4Description: Reference Circuit
footprint SOT23-8 (Footprint not found)
pins on every part: 4 -VS (power), 8 +VS (power)
part A pins: 1 VOUT 1 (out), 2 -IN 1 (in), 3 +IN 1 (in)
part B pins: 5 +IN 2 (in), 6 -IN 2 (in), 7 VOUT 2 (out)

## AD8036AN
designator U?
Single Channel Wide Bandwidth Operational Amplifier, 240 MHz BW, 1.2 KV/us SR, Industrial, 8-pin DIP (N-8), Tube; Generic Part Number: AD8036; PartNumber: AD8036AN; Amplifiers Per Package: 1; Input Bias Current: 4uA; Input Offset Voltage: 2mV; Iq/Amp: 21.5mA; Small Signal Bandwidth: 240MHz; V Span Max: 12V; V Span Min: 6V; DatasheetVersion: Rev. B; PackageVersion: 070606-A; PackageReference: N-8; PackageDescription: 8-Pin Plastic Dual In-Line Package, Row spacing 7.62 mm, Pitch 2.54 mm; Supplier Part Number 1: AD8036AN-ND; Slew Rate: 1.2KV/us; Mounting Technology: Through Hole; Code_JEDEC: MS-001; ComponentLink1Description: Manufacturer URL; ComponentLink2Description: Datasheet; ComponentLink3Description: Package Specification
footprint DIP8 (Footprint not found)
pins: 1 NC, 2 -IN (in), 3 +IN (in), 4 -VS (power), 5 VL (in), 6 OUT (out), 7 +VS (power), 8 VH (in)

## AD8036AR
designator U?
Single Channel Wide Bandwidth Operational Amplifier, 240 MHz BW, 1.2 KV/us SR, Industrial, 8-pin SOIC (R-8), Tube; Generic Part Number: AD8036; PartNumber: AD8036AR; Amplifiers Per Package: 1; Input Bias Current: 4uA; Input Offset Voltage: 2mV; Iq/Amp: 21.5mA; Small Signal Bandwidth: 240MHz; V Span Max: 12V; V Span Min: 6V; DatasheetVersion: Rev. B; PackageVersion: 060506-A; PackageReference: R-8; PackageDescription: 8-Pin Standard Small Outline Package, Body 3.9 x 4.9 mm, Pitch 1.27 mm; Supplier Part Number 1: AD8036AR-ND; Slew Rate: 1.2KV/us; Mounting Technology: Surface Mount; Code_JEDEC: MS-012-AA; ComponentLink1Description: Manufacturer URL; ComponentLink2Description: Datasheet; ComponentLink3Description: Package Specification
footprint SOIC8_1.27 (Footprint not found)
pins: 1 NC, 2 -IN (in), 3 +IN (in), 4 -VS (power), 5 VL (in), 6 OUT (out), 7 +VS (power), 8 VH (in)

## AD8037AR
designator U?
Single Channel Wide Bandwidth Operational Amplifier, 270 MHz BW, 1.5 KV/us SR, Industrial, 8-pin SOIC (R-8), Tube; Generic Part Number: AD8037; PartNumber: AD8037AR; Amplifiers Per Package: 1; Input Bias Current: 3uA; Input Offset Voltage: 2mV; Iq/Amp: 19.5mA; Small Signal Bandwidth: 270MHz; V Span Max: 12V; V Span Min: 6V; DatasheetVersion: Rev. B; PackageVersion: 060506-A; PackageReference: R-8; PackageDescription: 8-Pin Standard Small Outline Package, Body 3.9 x 4.9 mm, Pitch 1.27 mm; Supplier Part Number 1: AD8037AR-ND; Slew Rate: 1.5KV/us; Mounting Technology: Surface Mount; Code_JEDEC: MS-012-AA; ComponentLink1Description: Manufacturer URL; ComponentLink2Description: Datasheet; ComponentLink3Description: Package Specification
footprint SOIC8_1.27 (Footprint not found)
pins: 1 NC, 2 -IN (in), 3 +IN (in), 4 -VS (power), 5 VL (in), 6 OUT (out), 7 +VS (power), 8 VH (in)

## AD8038AKSZ-R2
designator U?
Single Channel Low Power Operational Amplifier, 350 MHz BW, 425 V/us SR, Industrial, 5-pin SOT23 (KS-5), Reel; Generic Part Number: AD8038; PartNumber: AD8038AKSZ-R2; Amplifiers Per Package: 1; Input Bias Current: 400nA; Input Offset Voltage: 500uV; Iq/Amp: 1.5mA; Small Signal Bandwidth: 350MHz; V Span Max: 12V; V Span Min: 3V; DatasheetVersion: Rev. G; PackageVersion: 072809-A; PackageReference: KS-5; PackageDescription: 5-Pin Thin Shrink Small Outline Transistor Package, Body 2 x 1.25 mm, Pitch 0.65 mm; Supplier Part Number 1: 59K6258; Slew Rate: 425V/us; Mounting Technology: Surface Mount; Code_JEDEC: MO-203-AA; ComponentLink1Description: Manufacturer URL; ComponentLink2Description: Datasheet; ComponentLink3Description: Package Specification; ComponentLink4Description: Reference Circuit
footprint SOT353 (Footprint not found)
pins: 1 VOUT (out), 2 -VS (power), 3 +IN (in), 4 -IN (in), 5 +VS (power)

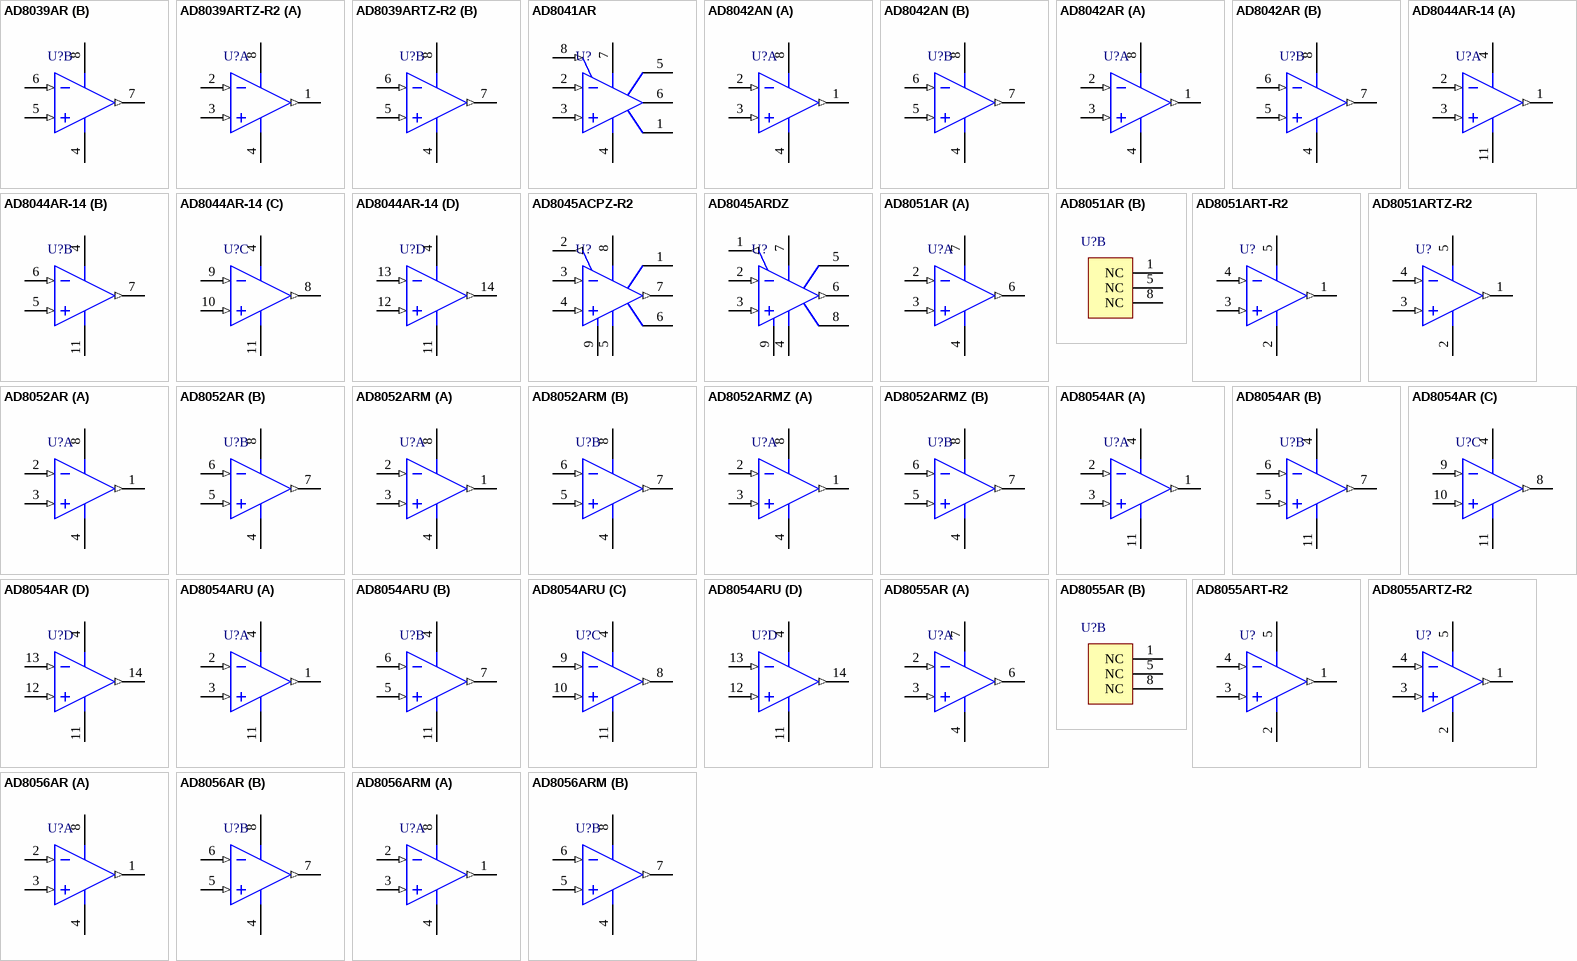
[diagram p92: symbols AD8039AR to AD8056ARM]

## AD8039AR
designator U?
Double Channel Low Power Operational Amplifier, 350 MHz BW, 425 V/us SR, Industrial, 8-pin SOIC (R-8), Tube; Generic Part Number: AD8039; PartNumber: AD8039AR; Amplifiers Per Package: 2; Input Bias Current: 400nA; Input Offset Voltage: 500uV; Iq/Amp: 1.5mA; Small Signal Bandwidth: 350MHz; V Span Max: 12V; V Span Min: 3V; DatasheetVersion: Rev. G; PackageVersion: 060506-A; PackageReference: R-8; PackageDescription: 8-Pin Standard Small Outline Package, Body 3.9 x 4.9 mm, Pitch 1.27 mm; Supplier Part Number 1: AD8039AR-ND; Slew Rate: 425V/us; Mounting Technology: Surface Mount; Code_JEDEC: MS-012-AA; ComponentLink1Description: Manufacturer URL; ComponentLink2Description: Datasheet; ComponentLink3Description: Package Specification
footprint SOIC8_1.27 (Footprint not found)
pins on every part: 4 -VS (power), 8 +VS (power)
part A pins: 1 VOUT 1 (out), 2 -IN 1 (in), 3 +IN 1 (in)
part B pins: 5 +IN 2 (in), 6 -IN 2 (in), 7 VOUT 2 (out)

## AD8039ARTZ-R2
designator U?
Double Channel Low Power Operational Amplifier, 350 MHz BW, 425 V/us SR, Industrial, 8-pin SOT23 (RJ-8), Reel; Generic Part Number: AD8039; PartNumber: AD8039ARTZ-R2; Amplifiers Per Package: 2; Input Bias Current: 400nA; Input Offset Voltage: 500uV; Iq/Amp: 1.5mA; Small Signal Bandwidth: 350MHz; V Span Max: 12V; V Span Min: 3V; DatasheetVersion: Rev. G; PackageVersion: 121608-A; PackageReference: RJ-8; PackageDescription: 8-Pin Small Outline Transistor Package, Body 2.9 x 1.6 mm, Pitch 0.65 mm; Slew Rate: 425V/us; Mounting Technology: Surface Mount; Code_JEDEC: MO-178-BA; ComponentLink1Description: Manufacturer URL; ComponentLink2Description: Datasheet; ComponentLink3Description: Package Specification
footprint SOT23-8 (Footprint not found)
pins on every part: 4 -VS (power), 8 +VS (power)
part A pins: 1 VOUT 1 (out), 2 -IN 1 (in), 3 +IN 1 (in)
part B pins: 5 +IN 2 (in), 6 -IN 2 (in), 7 VOUT 2 (out)

## AD8041AR
designator U?
Single Channel Low Power Operational Amplifier, 170 MHz BW, 170 V/us SR, Industrial, 8-pin SOIC (R-8), Tube; Generic Part Number: AD8041; PartNumber: AD8041AR; Amplifiers Per Package: 1; Input Bias Current: 1.2uA; Input Offset Voltage: 2mV; Iq/Amp: 6.5mA; Small Signal Bandwidth: 170MHz; V Span Max: 12V; V Span Min: 3V; DatasheetVersion: Rev. B; PackageVersion: 060506-A; PackageReference: R-8; PackageDescription: 8-Pin Standard Small Outline Package, Body 3.9 x 4.9 mm, Pitch 1.27 mm; Supplier Part Number 1: AD8041AR-ND; Slew Rate: 170V/us; Mounting Technology: Surface Mount; Code_JEDEC: MS-012-AA; ComponentLink1Description: Manufacturer URL; ComponentLink2Description: Datasheet; ComponentLink3Description: Package Specification
footprint SOIC8_1.27 (Footprint not found)
pins: 1 NC, 2 -INPUT (in), 3 +INPUT (in), 4 -VS (power), 5 NC, 6 OUTPUT (hiz), 7 +VS (power), 8 ~{DISABLE} (in)